# Altium footprint library UZ_CarrierBoard.PcbLib: 91 footprints (part 6 of 6)
Each footprint in its own frame and in the unit in brackets; x right, y up, seen from the top. Pads: shape width x height; smd on the part's side, far side on the other; paste and mask are expansions set on the pad; w line width, h text height; cw(c..) or ccw(c..) is an arc to the next point about the centre after c.
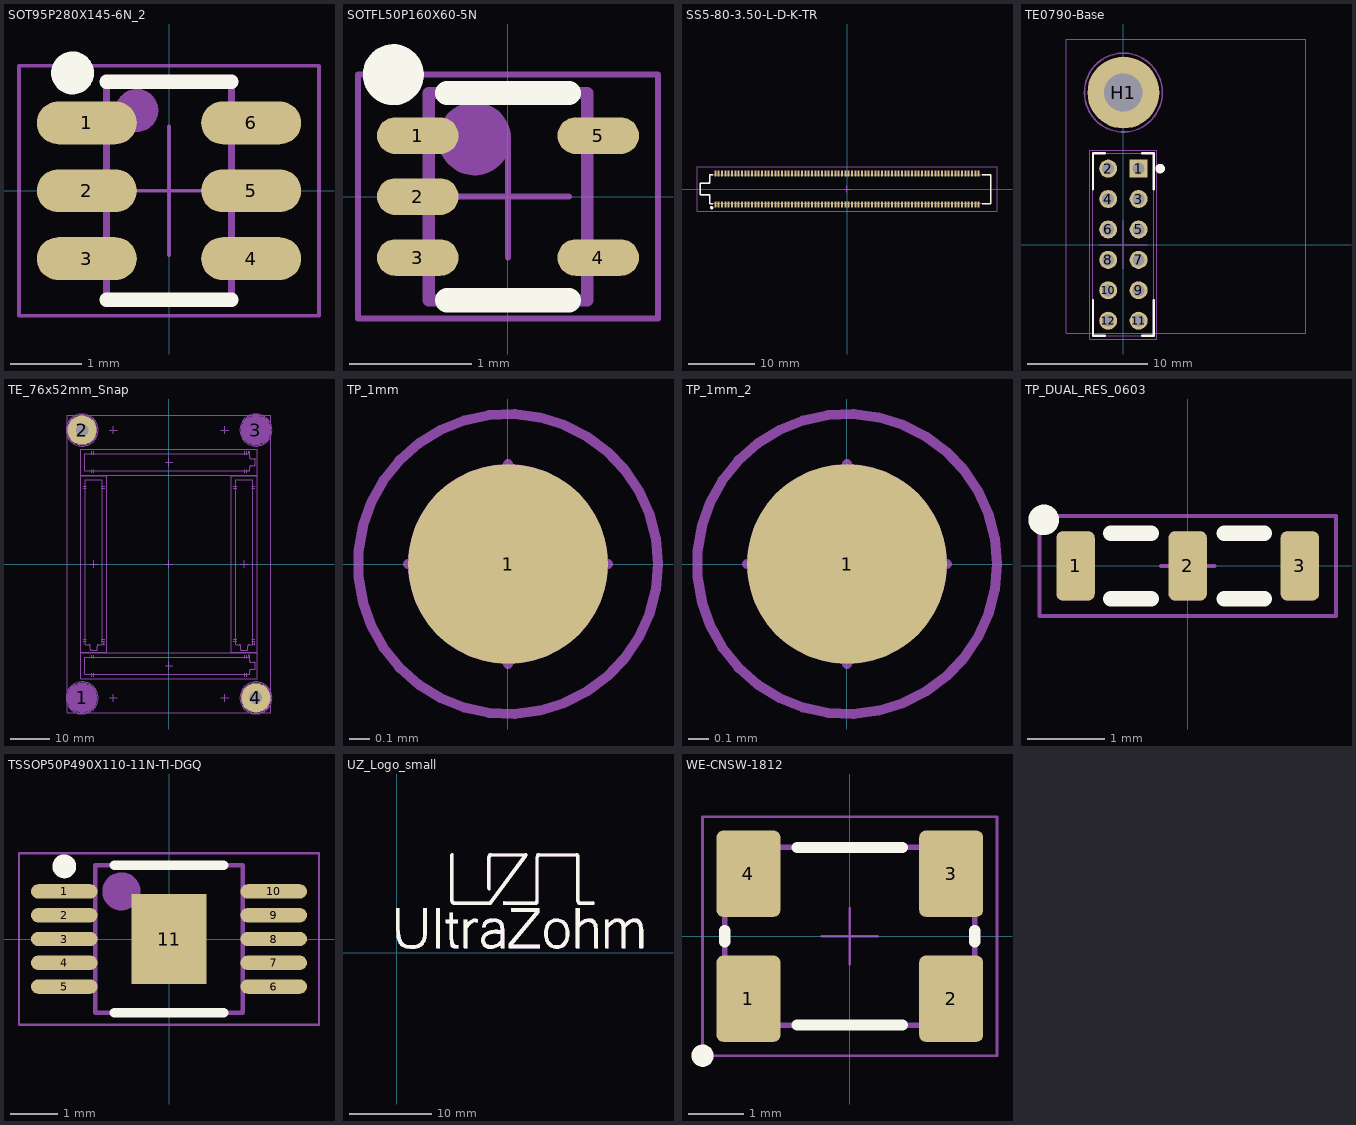
[diagram p5: the footprints below, top view; thin cyan lines are the x and y axes]

## SOT95P280X145-6N_2 [mm]
pads (6):
  oval 1.4x0.6 smd: 1(-1.15,0.95) 2(-1.15,0) 3(-1.15,-0.95) 4(1.15,-0.95) 5(1.15,0) 6(1.15,0.95)
Top Overlay:
  circle w0.3: c-1.35,1.65 r0.15
  lines w0.2: -0.875,-1.525 0.874,-1.525 ; -0.874,1.525 0.875,1.525
Mechanical 13:
  circle w0.3: c-0.45,1.125 r0.15
  lines w0.1: -0.875,-1.525 0.875,-1.525 0.875,1.525 -0.875,1.525 -0.875,-1.525
  text ".Designator" at -0.116,0.521 h0.7
Mechanical 15:
  lines w0.05: -0.9,0 0,0 ; 0,-0.9 0,0 ; 0,0.9 0,0 ; 0.9,0 0,0 ; -2.1,-1.75 2.1,-1.75 2.1,1.75 -2.1,1.75 -2.1,-1.75
3D body "SOT95P270X145-6L50.STEP": height 1.45, standoff 0, extent -1.35,-1.45 1.35,1.45

## SOTFL50P160X60-5N [mm]
pads (5):
  oval 0.67x0.3 smd: 1(-0.74,0.5) 2(-0.74,0) 3(-0.74,-0.5) 4(0.74,-0.5) 5(0.74,0.5)
Top Overlay:
  circle w0.25: c-0.94,1 r0.125
  lines w0.2: -0.5,-0.85 0.5,-0.85 ; -0.5,0.85 0.5,0.85
Mechanical 13:
  circle w0.3: c-0.275,0.475 r0.15
  lines w0.1: -0.65,-0.85 0.65,-0.85 0.65,0.85 -0.65,0.85 -0.65,-0.85
  text ".Designator" at 0.928,-0.462 h1
Mechanical 15:
  lines w0.05: -0.5,0 0.5,0 ; 0,-0.5 0,0.5 ; -1.23,-1 1.23,-1 1.23,1 -1.23,1 -1.23,-1
3D body "SOT-665.STEP": height 0.6, standoff 0, extent -0.85,-0.85 0.85,0.85

## SS5-80-3.50-L-D-K-TR [mm]
pads (160):
  rrect20% 0.3x0.93 smd: 1(-19.75,-2.335) 2(-19.75,2.335) 3(-19.25,-2.335) 4(-19.25,2.335) 5(-18.75,-2.335) 6(-18.75,2.335) 7(-18.25,-2.335) 8(-18.25,2.335) 9(-17.75,-2.335) 10(-17.75,2.335) 11(-17.25,-2.335) 12(-17.25,2.335) 13(-16.75,-2.335) 14(-16.75,2.335) 15(-16.25,-2.335) 16(-16.25,2.335) 17(-15.75,-2.335) 18(-15.75,2.335) 19(-15.25,-2.335) 20(-15.25,2.335) 21(-14.75,-2.335) 22(-14.75,2.335) 23(-14.25,-2.335) 24(-14.25,2.335) 25(-13.75,-2.335) 26(-13.75,2.335) 27(-13.25,-2.335) 28(-13.25,2.335) 29(-12.75,-2.335) 30(-12.75,2.335) 31(-12.25,-2.335) 32(-12.25,2.335) 33(-11.75,-2.335) 34(-11.75,2.335) 35(-11.25,-2.335) 36(-11.25,2.335) 37(-10.75,-2.335) 38(-10.75,2.335) 39(-10.25,-2.335) 40(-10.25,2.335) 41(-9.75,-2.335) 42(-9.75,2.335) 43(-9.25,-2.335) 44(-9.25,2.335) 45(-8.75,-2.335) 46(-8.75,2.335) 47(-8.25,-2.335) 48(-8.25,2.335) 49(-7.75,-2.335) 50(-7.75,2.335) 51(-7.25,-2.335) 52(-7.25,2.335) 53(-6.75,-2.335) 54(-6.75,2.335) 55(-6.25,-2.335) 56(-6.25,2.335) 57(-5.75,-2.335) 58(-5.75,2.335) 59(-5.25,-2.335) 60(-5.25,2.335) 61(-4.75,-2.335) 62(-4.75,2.335) 63(-4.25,-2.335) 64(-4.25,2.335) 65(-3.75,-2.335) 66(-3.75,2.335) 67(-3.25,-2.335) 68(-3.25,2.335) 69(-2.75,-2.335) 70(-2.75,2.335) 71(-2.25,-2.335) 72(-2.25,2.335) 73(-1.75,-2.335) 74(-1.75,2.335) 75(-1.25,-2.335) 76(-1.25,2.335) 77(-0.75,-2.335) 78(-0.75,2.335) 79(-0.25,-2.335) 80(-0.25,2.335) 81(0.25,-2.335) 82(0.25,2.335) 83(0.75,-2.335) 84(0.75,2.335) 85(1.25,-2.335) 86(1.25,2.335) 87(1.75,-2.335) 88(1.75,2.335) 89(2.25,-2.335) 90(2.25,2.335) 91(2.75,-2.335) 92(2.75,2.335) 93(3.25,-2.335) 94(3.25,2.335) 95(3.75,-2.335) 96(3.75,2.335) 97(4.25,-2.335) 98(4.25,2.335) 99(4.75,-2.335) 100(4.75,2.335) 101(5.25,-2.335) 102(5.25,2.335) 103(5.75,-2.335) 104(5.75,2.335) 105(6.25,-2.335) 106(6.25,2.335) 107(6.75,-2.335) 108(6.75,2.335) 109(7.25,-2.335) 110(7.25,2.335) 111(7.75,-2.335) 112(7.75,2.335) 113(8.25,-2.335) 114(8.25,2.335) 115(8.75,-2.335) 116(8.75,2.335) 117(9.25,-2.335) 118(9.25,2.335) 119(9.75,-2.335) 120(9.75,2.335) 121(10.25,-2.335) 122(10.25,2.335) 123(10.75,-2.335) 124(10.75,2.335) 125(11.25,-2.335) 126(11.25,2.335) 127(11.75,-2.335) 128(11.75,2.335) 129(12.25,-2.335) 130(12.25,2.335) 131(12.75,-2.335) 132(12.75,2.335) 133(13.25,-2.335) 134(13.25,2.335) 135(13.75,-2.335) 136(13.75,2.335) 137(14.25,-2.335) 138(14.25,2.335) 139(14.75,-2.335) 140(14.75,2.335) 141(15.25,-2.335) 142(15.25,2.335) 143(15.75,-2.335) 144(15.75,2.335) 145(16.25,-2.335) 146(16.25,2.335) 147(16.75,-2.335) 148(16.75,2.335) 149(17.25,-2.335) 150(17.25,2.335) 151(17.75,-2.335) 152(17.75,2.335) 153(18.25,-2.335) 154(18.25,2.335) 155(18.75,-2.335) 156(18.75,2.335) 157(19.25,-2.335) 158(19.25,2.335) 159(19.75,-2.335) 160(19.75,2.335)
Top Overlay:
  circle w0.25: c-20.3,-2.81 r0.125
  lines w0.2: -20.15,-2.175 -20.58,-2.175 -20.58,-0.9 -21.98,-0.9 -21.98,0.9 -20.58,0.9 -20.58,2.175 -20.15,2.175 ; 20.3,-2.175 21.571,-2.175 21.571,2.175 20.3,2.175
Mechanical 13:
  lines w0.1: -21.98,-0.75 ccw(c-21.83,-0.75) -21.83,-0.9 -20.98,-0.9 cw(c-20.98,-1.3) -20.58,-1.3 -20.58,-2.175 21.56,-2.175 21.56,2.175 -20.58,2.175 -20.58,1.3 cw(c-20.98,1.3) -20.98,0.9 -21.83,0.9 ccw(c-21.83,0.75) -21.98,0.75 -21.98,-0.75
  text ".Designator" at -0.122,-0.586 h1.3
  text "1" at -19.975,-1.65 h1
  text "2" at -20.125,0.7 h1
  text "159" at 18.725,-1.625 h1
  text "160" at 18.825,0.725 h1
Mechanical 15:
  lines w0.05: -0.5,0 0.5,0 ; 0,-0.5 0,0.5 ; -22.5,-3.3 22.5,-3.3 22.5,3.3 -22.5,3.3 -22.5,-3.3
3D body "SS5_80_3_50_L_D_K_TR.STEP": height 4.01, standoff 0.01, extent -21.98,-2.5 21.56,2.5

## TE0790-Base [mm]
pads (13):
  rect 1.5x1.5 hole 1: 1(1.27,6.35)
  round 1.5 hole 1: 2(-1.27,6.35) 3(1.27,3.81) 4(-1.27,3.81) 5(1.27,1.27) 6(-1.27,1.27) 7(1.27,-1.27) 8(-1.27,-1.27) 9(1.27,-3.81) 10(-1.27,-3.81) 11(1.27,-6.35) 12(-1.27,-6.35)
  round 6 hole 3.2: H1(0,12.7)
Top Overlay:
  circle w0.4: c3.07,6.35 r0.2
  lines w0.2: -2.54,-4.62 -2.54,-7.62 -1.56,-7.62 ; -2.54,4.62 -2.54,7.62 -1.56,7.62 ; 1.56,-7.62 2.54,-7.62 2.54,-4.62 ; 1.56,7.62 2.54,7.62 2.54,4.62
Mechanical 11:
  lines w0.1: -4.78,-7.38 -4.78,17.174 15.24,17.174 15.24,-7.38 -4.78,-7.38
Mechanical 13:
  circle w0.1: c0,12.7 r3.25
  circle w0.1: c0,12.7 r1.6
  lines w0.1: -2.54,-7.62 -2.54,7.62 2.54,7.62 2.54,-7.62 -2.54,-7.62
  text "11" at 1,-5.23 h1
  text "12" at -2,-5.23 h1
  text "2" at -2,6.73 h1
  text "1" at 1,6.73 h1
  text ".Designator" at -0.469,0.682 h1
Mechanical 14:
  circle w0.1: c0,12.7 r1.6
  circle w0.1: c0,12.7 r3.25
Mechanical 15:
  circle w0.05: c0,12.7 r3.3
  lines w0.05: -2,0 2,0 ; -1,12.7 1,12.7 ; 0,-2 0,2 ; 0,11.7 0,13.7 ; -2.8,-7.88 -2.8,7.88 2.8,7.88 2.8,-7.88 -2.8,-7.88
Mechanical 16:
  circle w0.05: c0,12.7 r3.3
3D body "TE0790-01.step": height 14.23, standoff 2.57, extent -4.78,-7.62 15.24,18.697
3D body "female_header_a-bl254-dg-g12d.stp": height 8.5, standoff -3.2, extent -2.5,-7.745 2.5,7.745

## TE_76x52mm_Snap [mm]
pads (4):
  round 7.5 on Mech7: 1(-22.2,-34.2) 3(22.2,34.2)
  round 7.5 hole 3.2: 2(-22.2,34.2) 4(22.2,-34.2)
Mechanical 7:
  circle w0.05: c-22.2,-34.2 r4.1
  circle w0.05: c22.2,34.2 r4.1
  circle w0.1: c-22.2,-34.2 r3.8
  circle w0.1: c-22.2,-34.2 r1.6
  circle w0.1: c22.2,34.2 r3.8
  circle w0.1: c22.2,34.2 r1.6
  lines w0.05: -23.2,-34.2 -21.2,-34.2 -23.2,-34.2 ; -22.2,-35.2 -22.2,-33.2 -22.2,-35.2 ; 21.2,34.2 23.2,34.2 21.2,34.2 ; 22.2,33.2 22.2,35.2 22.2,33.2
Mechanical 8:
  circle w0.05: c22.2,34.2 r4.1
  circle w0.05: c-22.2,-34.2 r4.1
  circle w0.1: c-22.2,-34.2 r3.8
  circle w0.1: c-22.2,-34.2 r1.6
  circle w0.1: c22.2,34.2 r3.8
  circle w0.1: c22.2,34.2 r1.6
  lines w0.05: -23.2,-34.2 -21.2,-34.2 -23.2,-34.2 ; -22.2,-35.2 -22.2,-33.2 -22.2,-35.2 ; 21.2,34.2 23.2,34.2 21.2,34.2 ; 22.2,33.2 22.2,35.2 22.2,33.2
Mechanical 11:
  circle w0.3: c-16.625,-20.425 r0.15
  circle w0.3: c20.424,-23.425 r0.15
  circle w0.3: c21.772,-20.424 r0.15
  circle w0.3: c20.422,28.574 r0.15
  region: -17.33,-19.1 -17.33,-19.4 -16.4,-19.4 -16.4,-19.1
  region: -17.33,-19.6 -17.33,-19.9 -16.4,-19.9 -16.4,-19.6
  region: -22,-19.1 -22,-19.4 -21.07,-19.4 -21.07,-19.1
  region: -22,-19.6 -22,-19.9 -21.07,-19.9 -21.07,-19.6
  region: -22,19.9 -22,19.6 -21.07,19.6 -21.07,19.9
  region: -22,19.4 -22,19.1 -21.07,19.1 -21.07,19.4
  region: -17.33,19.9 -17.33,19.6 -16.4,19.6 -16.4,19.9
  region: -17.33,19.4 -17.33,19.1 -16.4,19.1 -16.4,19.4
  region: -19.1,24.13 -19.4,24.13 -19.4,23.2 -19.1,23.2
  region: -19.6,24.13 -19.9,24.13 -19.9,23.2 -19.6,23.2
  region: -19.1,28.8 -19.4,28.8 -19.4,27.87 -19.1,27.87
  region: -19.6,28.8 -19.9,28.8 -19.9,27.87 -19.6,27.87
  region: 19.9,28.8 19.6,28.8 19.6,27.87 19.9,27.87
  region: 19.4,28.8 19.1,28.8 19.1,27.87 19.4,27.87
  region: 19.9,24.13 19.6,24.13 19.6,23.2 19.9,23.2
  region: 19.4,24.13 19.1,24.13 19.1,23.2 19.4,23.2
  region: 17.33,19.1 17.33,19.4 16.4,19.4 16.4,19.1
  region: 17.33,19.6 17.33,19.9 16.4,19.9 16.4,19.6
  region: 22,19.1 22,19.4 21.07,19.4 21.07,19.1
  region: 22,19.6 22,19.9 21.07,19.9 21.07,19.6
  region: 22,-19.9 22,-19.6 21.07,-19.6 21.07,-19.9
  region: 22,-19.4 22,-19.1 21.07,-19.1 21.07,-19.4
  region: 17.33,-19.9 17.33,-19.6 16.4,-19.6 16.4,-19.9
  region: 17.33,-19.4 17.33,-19.1 16.4,-19.1 16.4,-19.4
  rectangle: -19.4,-24.13 -19.1,-23.2
  rectangle: -19.9,-24.13 -19.6,-23.2
  rectangle: -19.4,-28.8 -19.1,-27.87
  rectangle: -19.9,-28.8 -19.6,-27.87
  rectangle: 19.6,-28.8 19.9,-27.87
  rectangle: 19.1,-28.8 19.4,-27.87
  rectangle: 19.6,-24.13 19.9,-23.2
  rectangle: 19.1,-24.13 19.4,-23.2
  lines w0.05: -23.2,-34.2 -21.2,-34.2 ; -23.2,34.2 -21.2,34.2 ; -22.2,-35.2 -22.2,-33.2 ; -22.2,33.2 -22.2,35.2 ; -20.2,0 -18.2,0 ; -19.2,-1 -19.2,1 ; -15.2,-34.2 -13.2,-34.2 ; -15.2,34.2 -13.2,34.2 ; -14.2,-35.2 -14.2,-33.2 ; -14.2,33.2 -14.2,35.2 ; -1,-26 1,-26 ; -1,0 1,0 ; -1,26 1,26 ; 0,-27 0,-25 ; 0,-1 0,1 ; 0,25 0,27 ; 13.2,-34.2 15.2,-34.2 ; 13.2,34.2 15.2,34.2 ; 14.2,-35.2 14.2,-33.2 ; 14.2,33.2 14.2,35.2 ; 18.2,0 20.2,0 ; 19.2,-1 19.2,1 ; 21.2,-34.2 23.2,-34.2 ; 21.2,34.2 23.2,34.2 ; 22.2,-35.2 22.2,-33.2 ; 22.2,33.2 22.2,35.2 ; -26,-38 -26,38 26,38 26,-38 -26,-38 ; -22.503,22.699 22.497,22.699 22.497,29.299 -22.503,29.299 -22.503,22.699 ; -22.5,-29.3 -22.5,-22.7 22.5,-22.7 22.5,-29.3 -22.5,-29.3 ; -22.5,-22.501 -15.9,-22.501 -15.9,22.499 -22.5,22.499 -22.5,-22.501 ; 15.897,-22.501 22.497,-22.501 22.497,22.499 15.897,22.499 15.897,-22.501
  lines w0.1: -21.56,-28.175 -21.56,-23.825 20.58,-23.825 20.58,-24.7 ccw(c20.98,-24.7) 20.98,-25.1 21.83,-25.1 cw(c21.83,-25.25) 21.98,-25.25 21.98,-26.75 cw(c21.83,-26.75) 21.83,-26.9 20.98,-26.9 ccw(c20.98,-27.3) 20.58,-27.3 20.58,-28.175 -21.56,-28.175 ; -21.56,23.825 -21.56,28.175 20.58,28.175 20.58,27.3 ccw(c20.98,27.3) 20.98,26.9 21.83,26.9 cw(c21.83,26.75) 21.98,26.75 21.98,25.25 cw(c21.83,25.25) 21.83,25.1 20.98,25.1 ccw(c20.98,24.7) 20.58,24.7 20.58,23.825 -21.56,23.825 ; -21.375,-20.58 -20.5,-20.58 cw(c-20.5,-20.98) -20.1,-20.98 -20.1,-21.83 ccw(c-19.95,-21.83) -19.95,-21.98 -18.45,-21.98 ccw(c-18.45,-21.83) -18.3,-21.83 -18.3,-20.98 cw(c-17.9,-20.98) -17.9,-20.58 -17.025,-20.58 -17.025,21.56 -21.375,21.56 -21.375,-20.58 ; 17.025,-20.58 17.9,-20.58 cw(c17.9,-20.98) 18.3,-20.98 18.3,-21.83 ccw(c18.45,-21.83) 18.45,-21.98 19.95,-21.98 ccw(c19.95,-21.83) 20.1,-21.83 20.1,-20.98 cw(c20.5,-20.98) 20.5,-20.58 21.375,-20.58 21.375,21.56 17.025,21.56 17.025,-20.58
  text "160" at -21.025,-27.725 h1
  text "159" at -21.025,-25.375 h1
  text "2" at 19.45,-27.725 h1
  text "1" at 19.617,-25.375 h1
  text "160" at 17.475,21.025 h1
  text "159" at 19.825,21.025 h1
  text "2" at 17.475,-19.45 h1
  text "1" at 19.825,-19.617 h1
  text "160" at -20.925,21.025 h1
  text "159" at -18.575,21.025 h1
  text "2" at -20.925,-19.45 h1
  text "1" at -18.575,-19.617 h1
  text "1" at 19.617,26.625 h1
  text "2" at 19.45,24.275 h1
  text "159" at -21.025,26.625 h1
  text "160" at -21.025,24.275 h1
  text "J4" at -3.525,25.45 h1
  text "J2" at -20.025,2.1 h1
  text "J1" at 18.425,2.075 h1
  text "J3" at -3.525,-26.475 h1
Mechanical 13:
  circle w0.1: c-22.2,34.2 r3.8
  circle w0.1: c-22.2,34.2 r1.6
  circle w0.1: c22.2,-34.2 r3.8
  circle w0.1: c22.2,-34.2 r1.6
Mechanical 14:
  circle w0.1: c-22.2,34.2 r3.8
  circle w0.1: c-22.2,34.2 r1.6
  circle w0.1: c22.2,-34.2 r3.8
  circle w0.1: c22.2,-34.2 r1.6
Mechanical 15:
  circle w0.05: c-22.2,34.2 r4.1
  circle w0.05: c22.2,-34.2 r4.1
  lines w0.05: -23.2,34.2 -21.2,34.2 -23.2,34.2 ; -22.2,33.2 -22.2,35.2 -22.2,33.2 ; 21.2,-34.2 23.2,-34.2 21.2,-34.2 ; 22.2,-35.2 22.2,-33.2 22.2,-35.2
Mechanical 16:
  circle w0.05: c-22.2,34.2 r4.1
  circle w0.05: c22.2,-34.2 r4.1
  lines w0.05: -23.2,34.2 -21.2,34.2 -23.2,34.2 ; -22.2,33.2 -22.2,35.2 -22.2,33.2 ; 21.2,-34.2 23.2,-34.2 21.2,-34.2 ; 22.2,-35.2 22.2,-33.2 22.2,-35.2

## TP_1mm [mm]
pads (1):
  round 1 smd paste-1: 1(0,0)
Mechanical 13:
  circle w0.6: c0,0 r0.2
  text ".Designator" at -1.3,2.8 h0.7
Mechanical 15:
  circle w0.05: c0,0 r0.75
  lines w0.05: -0.5,0 0.5,0 ; 0,-0.5 0,0.5

## TP_1mm_2 [mm]
pads (1):
  round 1 smd paste-1: 1(0,0)
Mechanical 13:
  circle w0.6: c0,0 r0.2
  text ".Designator" at 1,-0.5 h1
Mechanical 15:
  circle w0.05: c0,0 r0.75
  lines w0.05: -0.5,0 0.5,0 ; 0,-0.5 0,0.5

## TP_DUAL_RES_0603 [mm]
pads (3):
  rrect33% 0.5x0.9 smd: 1(-1.46,0) 2(0,0) 3(1.46,0)
Top Overlay:
  circle w0.2: c-1.875,0.6 r0.1
  lines w0.2: -1,-0.425 -0.475,-0.425 ; -1,0.425 -0.475,0.425 ; 0.475,-0.425 1,-0.425 ; 0.475,0.425 1,0.425
Mechanical 13:
  region: -1.7,0.375 -1.7,-0.375 -1.7,-0.39 -1.689,-0.418 -1.668,-0.439 -1.64,-0.45 -1.625,-0.45 -1.3,-0.45 -1.285,-0.45 -1.258,-0.439 -1.236,-0.417 -1.225,-0.39 -1.225,-0.375 -1.225,0.375 -1.225,0.39 -1.236,0.418 -1.258,0.439 -1.285,0.45 -1.3,0.45 -1.625,0.45 -1.64,0.45 -1.667,0.439 -1.689,0.418 -1.7,0.39
  region: -0.24,0.375 -0.24,-0.375 -0.24,-0.39 -0.229,-0.418 -0.208,-0.439 -0.18,-0.45 -0.165,-0.45 0.16,-0.45 0.175,-0.45 0.202,-0.439 0.224,-0.417 0.235,-0.39 0.235,-0.375 0.235,0.375 0.235,0.39 0.224,0.418 0.202,0.439 0.175,0.45 0.16,0.45 -0.165,0.45 -0.18,0.45 -0.207,0.439 -0.229,0.418 -0.24,0.39
  region: 1.22,0.375 1.22,-0.375 1.22,-0.39 1.231,-0.418 1.252,-0.439 1.28,-0.45 1.295,-0.45 1.62,-0.45 1.635,-0.45 1.662,-0.439 1.684,-0.417 1.695,-0.39 1.695,-0.375 1.695,0.375 1.695,0.39 1.684,0.418 1.662,0.439 1.635,0.45 1.62,0.45 1.295,0.45 1.28,0.45 1.253,0.439 1.231,0.418 1.22,0.39
  text ".Designator" at -1.2,7.157 h0.7
Mechanical 15:
  lines w0.05: -0.35,0 0.35,0 ; 0,-0.35 0,0.35 ; -1.93,-0.65 -1.93,0.65 1.93,0.65 1.93,-0.65 -1.93,-0.65
3D body "User Library-RESC1608X05N.STEP": height 0.45, standoff 0, extent -1.55,-0.425 0,0.425
3D body "User Library-RESC1608X05N.STEP": height 0.45, standoff 0, extent -0.025,-0.425 1.525,0.425

## TSSOP50P490X110-11N-TI-DGQ [mm]
pads (11):
  oval 1.4x0.3 smd: 1(-2.2,1) 2(-2.2,0.5) 3(-2.2,0) 4(-2.2,-0.5) 5(-2.2,-1) 6(2.2,-1) 7(2.2,-0.5) 8(2.2,0) 9(2.2,0.5) 10(2.2,1)
  rect 1.57x1.88 smd: 11(0,0)
Top Overlay:
  circle w0.25: c-2.2,1.525 r0.125
  lines w0.2: -1.15,-1.55 1.15,-1.55 ; -1.15,1.55 1.15,1.55
Mechanical 13:
  circle w0.4: c-1,1 r0.2
  lines w0.1: -1.55,-1.55 -1.55,1.55 1.55,1.55 1.55,-1.55 -1.55,-1.55
  text ".Designator" at -1.203,-0.839 h1
Mechanical 15:
  lines w0.05: -0.5,0 0.5,0 ; 0,-0.5 0,0.5 ; -3.15,-1.8 -3.15,1.8 3.15,1.8 3.15,-1.8 -3.15,-1.8
3D body "User Library-DGQ (S-PDSO-G10).STEP": height 1.1, standoff 0, extent -2.518,-1.55 2.518,1.55

## UZ_Logo_small [mm]
Top Overlay:
  drawing of 354 lines, arcs and shapes, not listed
Mechanical 13:
  drawing of 354 lines, arcs and shapes, not listed

## WE-CNSW-1812 [mm]
pads (4):
  rrect20% 1.15x1.55 smd: 1(-1.825,-1.125) 2(1.825,-1.125) 3(1.825,1.125) 4(-1.825,1.125)
Top Overlay:
  circle w0.2: c-2.65,-2.15 r0.1
  lines w0.2: -2.25,-0.1 -2.25,0.1 ; -0.95,-1.6 0.95,-1.6 ; -0.95,1.6 0.95,1.6 ; 2.25,-0.1 2.25,0.1
Mechanical 13:
  circle w0.2: c-1.8,1.1 r0.1
  lines w0.1: -2.25,-1.6 2.25,-1.6 2.25,1.6 -2.25,1.6 -2.25,-1.6
  text ".Designator" at -1.6,-0.45 h1
Mechanical 15:
  lines w0.05: -0.5,0 0.5,0 ; 0,-0.5 0,0.5 ; -2.65,-2.15 -2.65,2.15 2.65,2.15 2.65,-2.15 -2.65,-2.15
3D body "WE-CNSW_1812_CNSW (rev1).stp": height 2.81, standoff -0.04, extent -2.25,-1.6 2.25,1.6